# Altium footprint library Conectores.PcbLib: 122 footprints (part 5 of 8)
Each footprint in its own frame and in the unit in brackets; x right, y up, seen from the top. Pads: shape width x height; smd on the part's side, far side on the other; paste and mask are expansions set on the pad; w line width, h text height; cw(c..) or ccw(c..) is an arc to the next point about the centre after c.
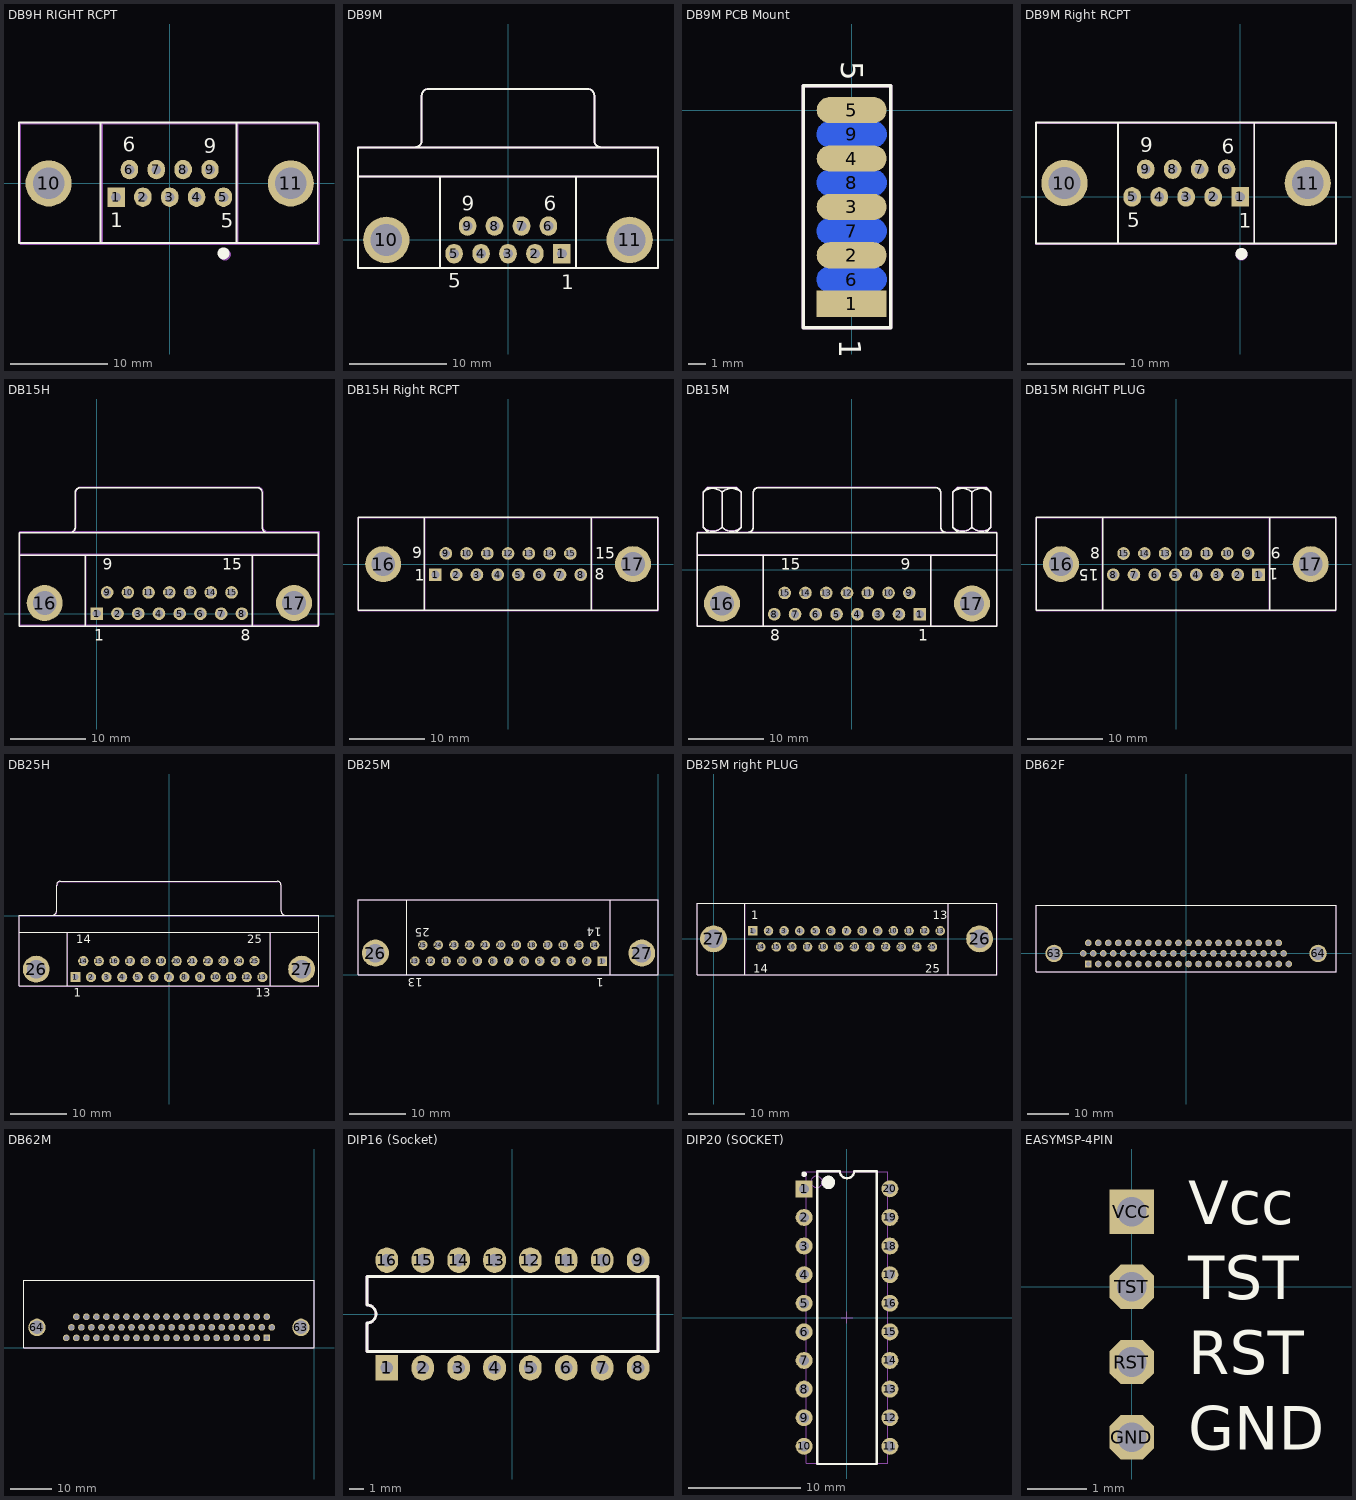
[diagram p4: the footprints below, top view; thin cyan lines are the x and y axes]

## DB9H RIGHT RCPT [mm] "DB9 Hembra recto"
pads (11):
  rect 1.8x2 hole 1: 1(-5.54,-1.42)
  oval 1.8x2 hole 1: 2(-2.77,-1.42) 3(0,-1.42) 4(2.77,-1.42) 5(5.54,-1.42) 6(-4.155,1.42) 7(-1.385,1.42) 8(1.385,1.42) 9(4.155,1.42)
  round 4.76 hole 3.26: 10(-12.495,0) 11(12.495,0)
Top Overlay:
  circle w1: c5.557,-7.218 r0.114
  lines w0.2: -7.13,-6.024 -7.13,6.295 ; 6.87,-6.101 6.87,6.244 ; -15.551,-6.151 15.27,-6.151 15.27,6.295 -15.551,6.295 -15.551,-6.151
  text "9" at 3.525,3.094 h1.5
  text "6" at -4.832,3.247 h1.5
  text "1" at -6.153,-4.5 h1.5
  text "5" at 5.277,-4.551 h1.5
Mechanical 29:
  circle w1: c5.687,-7.338 r0.114
  lines w0.2: -7,-6.144 -7,6.175 ; 7,-6.221 7,6.124 ; -15.421,-6.271 -15.421,6.175 15.4,6.175 15.4,-6.271 -15.421,-6.271
  text "5" at 5.407,-4.671 h1.5
  text "1" at -6.023,-4.62 h1.5
  text "6" at -4.702,3.127 h1.5
  text "9" at 3.655,2.974 h1.5
  text "'.Designator'" at -14.548,-5.482 h0.5
3D body "DB9Recept_VerticalMount.step": height 13.2, standoff -4.66, extent -15.405,-6.274 15.405,6.274

## DB9M [mm]
pads (11):
  rect 1.8x2 hole 1: 1(5.54,-1.42)
  oval 1.8x2 hole 1: 2(2.77,-1.42) 3(0,-1.42) 4(-2.77,-1.42) 5(-5.54,-1.42) 6(4.155,1.42) 7(1.385,1.42) 8(-1.385,1.42) 9(-4.155,1.42)
  round 4.76 hole 3.26: 10(-12.495,0) 11(12.495,0)
Top Overlay:
  lines w0.2: -15.4,6.5 15.4,6.5 ; -9.56,9.505 ccw(c-9.56,10.2) -8.865,10.2 -8.865,14.8 ; -8.86,14.805 cw(c-8.165,14.805) -8.165,15.5 8.165,15.5 cw(c8.165,14.805) 8.86,14.805 ; -7,-2.9 -7,6.5 ; 7,-2.9 7,6.5 ; 8.865,14.8 8.865,10.2 ccw(c9.56,10.2) 9.56,9.505 ; -15.4,-2.9 -15.4,9.5 15.4,9.5 15.4,-2.9 -15.4,-2.9
  text "1" at 5.484,-5.052 h1.5
  text "5" at -6.124,-4.925 h1.5
  text "9" at -4.727,3 h1.5
  text "6" at 3.655,2.974 h1.5
Mechanical 29:
  lines w0.2: -15.4,6.5 15.4,6.5 ; -9.56,9.505 ccw(c-9.56,10.2) -8.865,10.2 -8.865,14.8 ; -8.86,14.805 cw(c-8.165,14.805) -8.165,15.5 8.165,15.5 cw(c8.165,14.805) 8.86,14.805 ; -7,-2.9 -7,6.5 ; 7,-2.9 7,6.5 ; 8.865,14.8 8.865,10.2 ccw(c9.56,10.2) 9.56,9.505 ; -15.4,-2.9 15.4,-2.9 15.4,9.5 -15.4,9.5 -15.4,-2.9
  text "6" at 3.655,2.974 h1.5
  text "9" at -4.727,3 h1.5
  text "5" at -6.124,-4.925 h1.5
  text "1" at 5.484,-5.052 h1.5
  text "'.Designator'" at -14.738,7.698 h0.5
3D body "182-009-113.STEP": height 12.55, standoff -3.17, extent -15.395,-2.951 15.415,15.54

## DB9M PCB Mount [mm] "DB9H para montar entre PCB"
pads (9):
  rect 4x1.5 smd: 1(0,-11.08)
  oval 4x1.5 smd: 2(0,-8.31) 3(0,-5.54) 4(0,-2.77) 5(0,0)
  oval 4x1.5 smd far side: 6(0,-9.695) 7(0,-6.925) 8(0,-4.155) 9(0,-1.385)
Top Overlay:
  lines w0.2: -2.77,-12.465 -2.77,1.385 2.235,1.385 2.235,-12.465 -2.77,-12.465
  text "5" at -0.6,2.8 h1.27
  text "1" at -0.7,-13.1 h1.27
Mechanical 29:
  lines w0.2: -2.77,-12.465 2.235,-12.465 2.235,1.385 -2.77,1.385 -2.77,-12.465
  text "1" at -0.7,-13.1 h1.27
  text "5" at -0.6,2.8 h1.27
  text "'.Designator'" at -1.838,-12.018 h0.5

## DB9M Right RCPT [mm]
pads (11):
  rect 1.8x2 hole 1: 1(0,0)
  oval 1.8x2 hole 1: 2(-2.77,0) 3(-5.54,0) 4(-8.31,0) 5(-11.08,0) 6(-1.385,2.84) 7(-4.155,2.84) 8(-6.925,2.84) 9(-9.695,2.84)
  round 4.76 hole 3.26: 10(-18.035,1.42) 11(6.955,1.42)
Top Overlay:
  circle w1: c0.147,-5.858 r0.114
  lines w0.2: -12.54,-4.664 -12.54,7.655 ; 1.46,-4.741 1.46,7.604 ; -20.961,-4.791 -20.961,7.655 9.86,7.655 9.86,-4.791 -20.961,-4.791
  text "1" at -0.133,-3.191 h1.5
  text "5" at -11.563,-3.14 h1.5
  text "9" at -10.242,4.607 h1.5
  text "6" at -1.885,4.454 h1.5
Mechanical 29:
  circle w1: c0.147,-5.918 r0.114
  lines w0.2: -12.54,-4.724 -12.54,7.595 ; 1.46,-4.801 1.46,7.544 ; -20.961,-4.851 9.86,-4.851 9.86,7.595 -20.961,7.595 -20.961,-4.851
  text "6" at -1.885,4.394 h1.5
  text "9" at -10.242,4.547 h1.5
  text "5" at -11.563,-3.2 h1.5
  text "1" at -0.133,-3.251 h1.5
  text "'.Designator'" at -20.388,-4.212 h0.5
3D body "DB9 Macho Recto.step": height 13.5, standoff -3.7, extent -20.968,-4.905 9.832,7.595

## DB15H [mm]
pads (17):
  rect 1.69x1.69 hole 1.09: 1(0,0)
  round 1.69 hole 1.09: 2(2.77,0) 3(5.54,0) 4(8.31,0) 5(11.08,0) 6(13.85,0) 7(16.62,0) 8(19.39,0) 9(1.385,2.84) 10(4.155,2.84) 11(6.925,2.84) 12(9.695,2.84) 13(12.465,2.84) 14(15.235,2.84) 15(18.005,2.84)
  round 4.8 hole 3.18: 16(-6.965,1.42) 17(26.355,1.42)
Top Overlay:
  lines w0.2: -10.395,7.83 29.605,7.83 ; -3.59,10.835 ccw(c-3.59,11.53) -2.895,11.53 -2.895,16.13 ; -2.89,16.135 cw(c-2.195,16.135) -2.195,16.83 21.405,16.83 cw(c21.405,16.135) 22.1,16.135 ; -1.535,-1.67 -1.535,7.83 ; 20.745,-1.67 20.745,7.83 ; 22.105,16.13 22.105,11.53 ccw(c22.8,11.53) 22.8,10.835 ; -10.395,-1.67 -10.395,10.83 29.605,10.83 29.605,-1.67 -10.395,-1.67
  text "1" at -0.34,-3.645 h1.5
  text "8" at 19.257,-3.645 h1.5
  text "15" at 16.79,5.855 h1.5
  text "9" at 0.795,5.855 h1.5
Mechanical 29:
  lines w0.2: -10.305,7.92 29.695,7.92 ; -3.5,10.925 ccw(c-3.5,11.62) -2.805,11.62 -2.805,16.22 ; -2.8,16.225 cw(c-2.105,16.225) -2.105,16.92 21.495,16.92 cw(c21.495,16.225) 22.19,16.225 ; -1.445,-1.58 -1.445,7.92 ; 20.835,-1.58 20.835,7.92 ; 22.195,16.22 22.195,11.62 ccw(c22.89,11.62) 22.89,10.925 ; -10.305,-1.58 29.695,-1.58 29.695,10.92 -10.305,10.92 -10.305,-1.58
  text "9" at 0.885,5.945 h1.5
  text "15" at 16.88,5.945 h1.5
  text "8" at 19.347,-3.555 h1.5
  text "1" at -0.25,-3.555 h1.5
  text "'.Designator'" at -9.388,9.018 h0.5
3D body "DB15RA_F-DEFAULT.step": height 12.55, standoff -3.5, extent -10.183,-1.778 29.437,16.622

## DB15H Right RCPT [mm] "DB15 Hembra Recto"
pads (17):
  rect 1.69x1.69 hole 1.09: 1(-9.695,-1.42)
  round 1.69 hole 1.09: 2(-6.925,-1.42) 3(-4.155,-1.42) 4(-1.385,-1.42) 5(1.385,-1.42) 6(4.155,-1.42) 7(6.925,-1.42) 8(9.695,-1.42) 9(-8.31,1.42) 10(-5.54,1.42) 11(-2.77,1.42) 12(0,1.42) 13(2.77,1.42) 14(5.54,1.42) 15(8.31,1.42)
  round 4.8 hole 3.18: 16(-16.66,0) 17(16.66,0)
Top Overlay:
  lines w0.2: -20.02,-6.17 19.98,-6.17 ; -20.02,-6.168 -20.02,6.192 -19.982,6.23 19.98,6.23 ; -11.16,-6.142 -11.16,6.202 ; 11.12,-6.142 11.12,6.228 ; 19.98,-6.142 19.98,6.228
  text "1" at -12.441,-2.205 h1.5
  text "8" at 11.562,-2.104 h1.5
  text "15" at 11.613,0.741 h1.5
  text "9" at -12.771,0.767 h1.5
Mechanical 29:
  lines w0.2: -20,-6.2 20,-6.2 ; -20,-6.198 -20,6.162 -19.962,6.2 20,6.2 ; -11.14,-6.172 -11.14,6.172 ; 11.14,-6.172 11.14,6.198 ; 20,-6.172 20,6.198
  text "'.Designator'" at -19.338,4.918 h0.5
  text "9" at -12.751,0.737 h1.5
  text "15" at 11.633,0.711 h1.5
  text "8" at 11.582,-2.134 h1.5
  text "1" at -12.421,-2.235 h1.5
3D body "CircuitWorks-DB15_F.step": height 12.2, standoff -3.52, extent -19.975,-6.498 20.025,6.502

## DB15M [mm]
pads (17):
  rect 1.69x1.69 hole 1.09: 1(9.035,-5.916)
  round 1.69 hole 1.09: 2(6.265,-5.916) 3(3.495,-5.916) 4(0.725,-5.916) 5(-2.045,-5.916) 6(-4.815,-5.916) 7(-7.585,-5.916) 8(-10.355,-5.916) 9(7.65,-3.076) 10(4.88,-3.076) 11(2.11,-3.076) 12(-0.66,-3.076) 13(-3.43,-3.076) 14(-6.2,-3.076) 15(-8.97,-3.076)
  round 4.8 hole 3.18: 16(-17.32,-4.496) 17(16,-4.496)
Top Overlay:
  lines w0.2: -20.66,1.974 19.34,1.974 ; -19.848,5.674 -19.213,5.039 ; -19.848,5.674 -19.848,10.324 ; -19.848,10.339 -19.213,10.974 -15.403,10.974 -14.768,10.339 ; -17.308,5.674 -17.308,10.324 ; -15.403,5.039 -14.768,5.674 ; -14.768,9.06 -14.768,9.272 ; -14.768,10.324 -14.768,5.674 ; -13.855,4.979 ccw(c-13.855,5.674) -13.16,5.674 -13.16,10.274 ; -13.155,10.279 cw(c-12.46,10.279) -12.46,10.974 11.14,10.974 cw(c11.14,10.279) 11.835,10.279 ; -11.8,-7.526 -11.8,1.974 ; 10.48,-7.526 10.48,1.974 ; 11.84,10.274 11.84,5.674 ccw(c12.535,5.674) 12.535,4.979 ; 13.452,10.324 13.452,5.674 14.087,5.039 ; 13.452,10.339 14.087,10.974 17.897,10.974 18.532,10.339 ; 15.992,5.674 15.992,10.324 ; 17.897,5.039 18.532,5.674 18.532,10.324 ; 18.532,9.06 18.532,9.272 ; -20.66,-7.526 19.34,-7.526 19.34,4.974 -20.66,4.974 -20.66,-7.526
  lines w0.203: -19.85,5.671 ccw(c-18.578,6.944) -17.306,5.671 ; -19.848,10.324 cw(c-18.576,9.052) -17.304,10.324 ; -17.313,10.324 cw(c-16.04,9.052) -14.768,10.324 ; -17.31,5.671 ccw(c-16.038,6.944) -14.766,5.671 ; 13.45,5.671 ccw(c14.722,6.944) 15.994,5.671 ; 13.452,10.324 cw(c14.724,9.052) 15.996,10.324 ; 15.987,10.324 cw(c17.26,9.052) 18.532,10.324 ; 15.99,5.671 ccw(c17.262,6.944) 18.534,5.671
  text "15" at -9.47,-0.001 h1.5
  text "9" at 6.525,-0.001 h1.5
  text "1" at 8.87,-9.45 h1.5
  text "8" at -10.91,-9.45 h1.5
Mechanical 13:
  lines w0.1: -20.66,2.004 19.34,2.004 ; -19.85,5.701 ccw(c-18.578,6.974) -17.306,5.701 ; -19.848,5.704 -19.213,5.069 ; -19.848,5.704 -19.848,10.354 cw(c-18.576,9.082) -17.304,10.354 ; -19.848,10.369 -19.213,11.004 -15.403,11.004 -14.768,10.369 ; -17.313,10.354 cw(c-16.04,9.082) -14.768,10.354 -14.768,5.704 ; -17.31,5.701 ccw(c-16.038,6.974) -14.766,5.701 ; -17.308,5.704 -17.308,10.354 ; -15.403,5.069 -14.768,5.704 ; -14.768,9.09 -14.768,9.302 ; -13.855,5.009 ccw(c-13.855,5.704) -13.16,5.704 -13.16,10.304 ; -13.155,10.309 cw(c-12.46,10.309) -12.46,11.004 11.14,11.004 cw(c11.14,10.309) 11.835,10.309 ; -11.8,-7.496 -11.8,2.004 ; 10.48,-7.496 10.48,2.004 ; 11.84,10.304 11.84,5.704 ccw(c12.535,5.704) 12.535,5.009 ; 13.45,5.701 ccw(c14.722,6.974) 15.994,5.701 ; 13.452,10.369 14.087,11.004 17.897,11.004 18.532,10.369 ; 14.087,5.069 13.452,5.704 13.452,10.354 cw(c14.724,9.082) 15.996,10.354 ; 15.987,10.354 cw(c17.26,9.082) 18.532,10.354 18.532,5.704 17.897,5.069 ; 15.99,5.701 ccw(c17.262,6.974) 18.534,5.701 ; 15.992,5.704 15.992,10.354 ; 18.532,9.09 18.532,9.302 ; -20.66,-7.496 -20.66,5.004 19.34,5.004 19.34,-7.496 -20.66,-7.496
Mechanical 29:
  lines w0.2: -20.66,2.004 19.34,2.004 ; -19.848,5.704 -19.213,5.069 ; -19.848,5.704 -19.848,10.354 ; -19.848,10.369 -19.213,11.004 -15.403,11.004 -14.768,10.369 ; -17.308,5.704 -17.308,10.354 ; -15.403,5.069 -14.768,5.704 ; -14.768,9.09 -14.768,9.302 ; -14.768,10.354 -14.768,5.704 ; -13.855,5.009 ccw(c-13.855,5.704) -13.16,5.704 -13.16,10.304 ; -13.155,10.309 cw(c-12.46,10.309) -12.46,11.004 11.14,11.004 cw(c11.14,10.309) 11.835,10.309 ; -11.8,-7.496 -11.8,2.004 ; 10.48,-7.496 10.48,2.004 ; 11.84,10.304 11.84,5.704 ccw(c12.535,5.704) 12.535,5.009 ; 13.452,10.354 13.452,5.704 14.087,5.069 ; 13.452,10.369 14.087,11.004 17.897,11.004 18.532,10.369 ; 15.992,5.704 15.992,10.354 ; 17.897,5.069 18.532,5.704 18.532,10.354 ; 18.532,9.09 18.532,9.302 ; -20.66,-7.496 -20.66,5.004 19.34,5.004 19.34,-7.496 -20.66,-7.496
  lines w0.203: -19.85,5.701 ccw(c-18.578,6.974) -17.306,5.701 ; -19.848,10.354 cw(c-18.576,9.082) -17.304,10.354 ; -17.313,10.354 cw(c-16.04,9.082) -14.768,10.354 ; -17.31,5.701 ccw(c-16.038,6.974) -14.766,5.701 ; 13.45,5.701 ccw(c14.722,6.974) 15.994,5.701 ; 13.452,10.354 cw(c14.724,9.082) 15.996,10.354 ; 15.987,10.354 cw(c17.26,9.082) 18.532,10.354 ; 15.99,5.701 ccw(c17.262,6.974) 18.534,5.701
  text "'.Designator'" at -19.988,3.218 h0.5
  text "8" at -10.605,-9.471 h1.5
  text "1" at 8.535,-9.471 h1.5
  text "9" at 6.525,0.029 h1.5
  text "15" at -9.47,0.029 h1.5
3D body "User Library-DA-15P-1A5N-A191.STEP": height 13.6, standoff -3.95, extent -20.091,-7.784 19.409,13.016

## DB15M RIGHT PLUG [mm]
pads (17):
  rect 1.69x1.69 hole 1.09: 1(10.965,-1.369)
  round 1.69 hole 1.09: 2(8.195,-1.369) 3(5.425,-1.369) 4(2.655,-1.369) 5(-0.115,-1.369) 6(-2.885,-1.369) 7(-5.655,-1.369) 8(-8.425,-1.369) 9(9.58,1.471) 10(6.81,1.471) 11(4.04,1.471) 12(1.27,1.471) 13(-1.5,1.471) 14(-4.27,1.471) 15(-7.04,1.471)
  round 4.8 hole 3.18: 16(-15.39,0.051) 17(17.93,0.051)
Top Overlay:
  lines w0.2: -18.69,-6.119 21.31,-6.119 ; -18.69,-6.117 -18.69,6.243 -18.652,6.281 21.31,6.281 ; -9.83,-6.091 -9.83,6.253 ; 12.45,-6.091 12.45,6.278 ; 21.31,-6.091 21.31,6.278
  text "1" at 13.629,-0.529 h1.5
  text "8" at -11.492,0.767 h1.5
  text "15" at -10.323,-0.605 h1.5
  text "9" at 13.959,2.316 h1.5
Mechanical 29:
  lines w0.2: -18.73,-6.149 21.27,-6.149 ; -18.73,-6.147 -18.73,6.213 -18.692,6.251 21.27,6.251 ; -9.87,-6.121 -9.87,6.223 ; 12.41,-6.121 12.41,6.248 ; 21.27,-6.121 21.27,6.248
  text "'.Designator'" at -17.608,5.378 h0.5
  text "9" at 13.919,2.286 h1.5
  text "15" at -10.363,-0.635 h1.5
  text "8" at -11.532,0.737 h1.5
  text "1" at 13.589,-0.559 h1.5
3D body "DB15_M.step": height 12.37, standoff -3.49, extent -18.578,-6.426 21.422,6.574

## DB25H [mm]
pads (27):
  rect 1.8x1.8 hole 1.09: 1(-16.613,-10.903)
  round 1.8 hole 1.09: 2(-13.852,-10.903) 3(-11.091,-10.903) 4(-8.33,-10.903) 5(-5.569,-10.903) 6(-2.808,-10.903) 7(-0.047,-10.903) 8(2.714,-10.903) 9(5.475,-10.903) 10(8.236,-10.903) 11(10.997,-10.903) 12(13.758,-10.903) 13(16.519,-10.903) 14(-15.233,-8.063) 15(-12.472,-8.063) 16(-9.711,-8.063) 17(-6.95,-8.063) 18(-4.189,-8.063) 19(-1.428,-8.063) 20(1.333,-8.063) 21(4.094,-8.063) 22(6.855,-8.063) 23(9.616,-8.063) 24(12.377,-8.063) 25(15.138,-8.063)
  round 4.76 hole 3.26: 26(-23.573,-9.483) 27(23.479,-9.483)
Top Overlay:
  lines w0.2: -26.623,-2.903 26.477,-2.903 ; -20.668,0.102 ccw(c-20.668,0.797) -19.973,0.797 -19.973,5.397 ; -19.968,5.402 cw(c-19.273,5.402) -19.273,6.097 19.127,6.097 cw(c19.127,5.402) 19.822,5.402 ; -18.073,-12.403 -18.073,-2.903 ; 17.927,-12.403 17.927,-2.903 ; 19.827,5.397 19.827,0.797 ccw(c20.522,0.797) 20.522,0.102 ; -26.623,-12.403 -26.623,0.097 26.477,0.097 26.477,-12.403 -26.623,-12.403
  text "25" at 13.808,-4.878 h1.5
  text "14" at -16.438,-4.878 h1.5
  text "13" at 15.314,-14.378 h1.5
  text "1" at -16.943,-14.378 h1.5
Mechanical 29:
  lines w0.2: -26.543,-2.983 26.557,-2.983 ; -20.588,0.022 ccw(c-20.588,0.717) -19.893,0.717 -19.893,5.317 ; -19.888,5.322 cw(c-19.193,5.322) -19.193,6.017 19.207,6.017 cw(c19.207,5.322) 19.902,5.322 ; -17.993,-12.483 -17.993,-2.983 ; 18.007,-12.483 18.007,-2.983 ; 19.907,5.317 19.907,0.717 ccw(c20.602,0.717) 20.602,0.022 ; -26.543,-12.483 26.557,-12.483 26.557,0.017 -26.543,0.017 -26.543,-12.483
  text "'.Designator'" at -25.75,-1.71 h0.5
  text "1" at -16.863,-14.458 h1.5
  text "13" at 15.394,-14.458 h1.5
  text "14" at -16.358,-4.958 h1.5
  text "25" at 13.888,-4.958 h1.5
3D body "dsub25 H connector.step": height 4.08, standoff -13.08, extent -26.725,-12.703 26.315,7.797

## DB25M [mm]
pads (27):
  rect 1.69x1.69 hole 1.09: 1(-9.83,2.388)
  round 1.69 hole 1.09: 2(-12.591,2.388) 3(-15.352,2.388) 4(-18.113,2.388) 5(-20.874,2.388) 6(-23.635,2.388) 7(-26.396,2.388) 8(-29.157,2.388) 9(-31.918,2.388) 10(-34.679,2.388) 11(-37.44,2.388) 12(-40.201,2.388) 13(-42.962,2.388) 14(-11.21,5.228) 15(-13.971,5.228) 16(-16.732,5.228) 17(-19.493,5.228) 18(-22.254,5.228) 19(-25.015,5.228) 20(-27.776,5.228) 21(-30.537,5.228) 22(-33.298,5.228) 23(-36.059,5.228) 24(-38.82,5.228) 25(-41.581,5.228)
  round 4.76 hole 3.26: 26(-49.922,3.808) 27(-2.87,3.808)
Top Overlay:
  lines w0.2: -44.396,0.048 -44.396,13.259 ; -8.45,0.048 -8.45,13.259 ; -53,-0.002 -53,13.259 -0.004,13.259 -0.004,-0.002 -53,-0.002
  text "25" at -40.335,8.227 h1.5
  text "14" at -9.956,8.303 h1.5
  text "13" at -41.554,-0.612 h1.5
  text "1" at -9.601,-0.663 h1.5
Mechanical 29:
  lines w0.2: -44.396,0.048 -44.396,13.259 ; -8.45,0.048 -8.45,13.259 ; -53,-0.002 -0.004,-0.002 -0.004,13.259 -53,13.259 -53,-0.002
  text "'.Designator'" at -43.398,11.618 h0.5
  text "1" at -9.601,-0.663 h1.5
  text "13" at -41.554,-0.612 h1.5
  text "14" at -9.956,8.303 h1.5
  text "25" at -40.335,8.227 h1.5
3D body "DB25M PCB.STEP": height 12.57, standoff -3.15, extent -52.882,0.148 0.153,19.274

## DB25M right PLUG [mm]
pads (27):
  rect 1.69x1.69 hole 1.09: 1(6.96,1.42)
  round 1.69 hole 1.09: 2(9.721,1.42) 3(12.482,1.42) 4(15.243,1.42) 5(18.004,1.42) 6(20.765,1.42) 7(23.526,1.42) 8(26.287,1.42) 9(29.048,1.42) 10(31.809,1.42) 11(34.57,1.42) 12(37.331,1.42) 13(40.092,1.42) 14(8.34,-1.42) 15(11.101,-1.42) 16(13.862,-1.42) 17(16.623,-1.42) 18(19.384,-1.42) 19(22.145,-1.42) 20(24.906,-1.42) 21(27.667,-1.42) 22(30.428,-1.42) 23(33.189,-1.42) 24(35.95,-1.42) 25(38.711,-1.42)
  round 4.76 hole 3.26: 26(47.052,0) 27(0,0)
Top Overlay:
  lines w0.2: 5.52,-6.275 5.52,6.275 ; 41.467,-6.275 41.467,6.275 ; -2.926,-6.341 50.07,-6.341 50.07,6.298 -2.926,6.298 -2.926,-6.341
  text "1" at 6.65,3.48 h1.5
  text "13" at 38.782,3.48 h1.5
  text "14" at 7.03,-6.02 h1.5
  text "25" at 37.401,-6.02 h1.5
Mechanical 29:
  lines w0.2: 5.58,-6.275 5.58,6.275 ; 41.527,-6.275 41.527,6.275 ; -2.866,-6.341 -2.866,6.298 50.13,6.298 50.13,-6.341 -2.866,-6.341
  text "25" at 37.461,-6.02 h1.5
  text "14" at 7.09,-6.02 h1.5
  text "13" at 38.842,3.48 h1.5
  text "1" at 6.71,3.48 h1.5
  text "'.Designator'" at -1.648,5.018 h0.5
3D body "CircuitWorks-DB25_M.step": height 12.37, standoff -3.49, extent -3.506,-6.498 50.344,6.502

## DB62F [mm] "DB62 para PCB hembra"
pads (65):
  rect 1.6x1.6 hole 1.19: 1(-23.52,-2.54)
  round 1.6 hole 1.19: 2(-21.11,-2.54) 3(-18.7,-2.54) 4(-16.29,-2.54) 5(-13.88,-2.54) 6(-11.47,-2.54) 7(-9.06,-2.54) 8(-6.65,-2.54) 9(-4.24,-2.54) 10(-1.83,-2.54) 11(0.58,-2.54) 12(2.99,-2.54) 13(5.4,-2.54) 14(7.81,-2.54) 15(10.22,-2.54) 16(12.63,-2.54) 17(15.04,-2.54) 18(17.45,-2.54) 19(19.86,-2.54) 20(22.27,-2.54) 21(24.68,-2.54) 22(-24.74,0) 23(-22.33,0) 24(-19.92,0) 25(-17.51,0) 26(-15.1,0) 27(-12.69,0) 28(-10.28,0) 29(-7.87,0) 30(-5.46,0) 31(-3.05,0) 32(-0.64,0) 33(1.77,0) 34(4.18,0) 35(6.59,0) 36(9,0) 37(11.41,0) 38(13.82,0) 39(16.23,0) 40(18.64,0) 41(21.05,0) 42(23.46,0) 43(-23.52,2.54) 43(-23.52,2.54) 44(-21.11,2.54) 45(-18.7,2.54) 46(-16.29,2.54) 47(-13.88,2.54) 48(-11.47,2.54) 49(-9.06,2.54) 50(-6.65,2.54) 51(-4.24,2.54) 52(-1.83,2.54) 53(0.58,2.54) 54(2.99,2.54) 55(5.4,2.54) 56(7.81,2.54) 57(10.22,2.54) 58(12.63,2.54) 59(15.04,2.54) 60(17.45,2.54) 61(19.86,2.54) 62(22.27,2.54)
  round 4.2 hole 3.18: 63(-31.75,0) 64(31.75,0)
Top Overlay:
  lines w0.254: -36.09,-4.4 36.06,-4.4 36.06,11.55 -36.09,11.55 -36.09,-4.4
Top Paste:
  lines w0.254: -36.09,-4.579 -36.04,-4.6 ; 36.01,4.85 36.06,4.8
Mechanical 29:
  lines w0.254: -36.09,-4.4 -36.09,11.55 36.06,11.55 36.06,-4.4 -36.09,-4.4
  text "1" at -25.22,-2.91 h0.8
  text "'.Designator'" at -35.158,9.828 h0.5
3D body "DB62 Male.STEP": height 9.6, standoff -5, extent -36.14,-4.55 36.06,16.45

## DB62M [mm] "DB62 para PCB macho"
pads (64):
  rect 1.6x1.6 hole 1.19: 1(-11.385,2.362)
  round 1.6 hole 1.19: 2(-13.795,2.362) 3(-16.205,2.362) 4(-18.615,2.362) 5(-21.025,2.362) 6(-23.435,2.362) 7(-25.845,2.362) 8(-28.255,2.362) 9(-30.665,2.362) 10(-33.075,2.362) 11(-35.485,2.362) 12(-37.895,2.362) 13(-40.305,2.362) 14(-42.715,2.362) 15(-45.125,2.362) 16(-47.535,2.362) 17(-49.945,2.362) 18(-52.355,2.362) 19(-54.765,2.362) 20(-57.175,2.362) 21(-59.585,2.362) 22(-10.165,4.902) 23(-12.575,4.902) 24(-14.985,4.902) 25(-17.395,4.902) 26(-19.805,4.902) 27(-22.215,4.902) 28(-24.625,4.902) 29(-27.035,4.902) 30(-29.445,4.902) 31(-31.855,4.902) 32(-34.265,4.902) 33(-36.675,4.902) 34(-39.085,4.902) 35(-41.495,4.902) 36(-43.905,4.902) 37(-46.315,4.902) 38(-48.725,4.902) 39(-51.135,4.902) 40(-53.545,4.902) 41(-55.955,4.902) 42(-58.365,4.902) 43(-11.385,7.442) 44(-13.795,7.442) 45(-16.205,7.442) 46(-18.615,7.442) 47(-21.025,7.442) 48(-23.435,7.442) 49(-25.845,7.442) 50(-28.255,7.442) 51(-30.665,7.442) 52(-33.075,7.442) 53(-35.485,7.442) 54(-37.895,7.442) 55(-40.305,7.442) 56(-42.715,7.442) 57(-45.125,7.442) 58(-47.535,7.442) 59(-49.945,7.442) 60(-52.355,7.442) 61(-54.765,7.442) 62(-57.175,7.442)
  round 4.2 hole 3.18: 63(-3.155,4.902) 64(-66.655,4.902)
Top Overlay:
  lines w0.254: -69.825,0 0,0 0,16.23 -69.825,16.23 -69.825,0
Top Paste:
  lines w0.254: -70.965,0.102 -70.915,0.052 ; 1.135,9.502 1.185,9.481
Mechanical 29:
  lines w0.254: -69.825,0 -69.825,16.23 0,16.23 0,0 -69.825,0
  text "1" at -9.66,1.97 h0.8
  text "'.Designator'" at -68.848,14.488 h0.5
3D body "181-062-113.STEP": height 12.6, standoff -3.17, extent -69.703,0.127 -0.102,22.352

## DIP16 (Socket) [mm] "110-13-316-41-001000"
pads (16):
  rect 1.6x1.8 hole 0.9: 1(-8.89,-3.81)
  oval 1.6x1.8 hole 0.9: 2(-6.35,-3.81) 3(-3.81,-3.81) 4(-1.27,-3.81) 5(1.27,-3.81) 6(3.81,-3.81) 7(6.35,-3.81) 8(8.89,-3.81) 9(8.89,3.81) 10(6.35,3.81) 11(3.81,3.81) 12(1.27,3.81) 13(-1.27,3.81) 14(-3.81,3.81) 15(-6.35,3.81) 16(-8.89,3.81)
Top Overlay:
  lines w0.2: -10.3,-2.65 10.3,-2.65 10.3,2.65 -10.3,2.65 -10.3,0.635 cw(c-10.3,0) -10.3,-0.635 -10.3,-2.65
Mechanical 29:
  lines w0.2: -10.3,-2.65 -10.3,-0.635 ccw(c-10.3,0) -10.3,0.635 -10.3,2.65 10.3,2.65 10.3,-2.65 -10.3,-2.65
3D body "DIPS762W51P254L2032H419Q16_DIP_Socket_16__300.step": height 4.19, standoff -3.18, extent -10.18,-5.07 10.14,5.09

## DIP20 (SOCKET) [mm] "DIP, 20-Pin, Row Spacing 7.62 mm, Pitch 2.54 mm"
height 5.08
pads (20):
  rect 1.5x1.5 hole 0.9: 1(-3.81,11.43)
  round 1.5 hole 0.9: 2(-3.81,8.89) 3(-3.81,6.35) 4(-3.81,3.81) 5(-3.81,1.27) 6(-3.81,-1.27) 7(-3.81,-3.81) 8(-3.81,-6.35) 9(-3.81,-8.89) 10(-3.81,-11.43) 11(3.81,-11.43) 12(3.81,-8.89) 13(3.81,-6.35) 14(3.81,-3.81) 15(3.81,-1.27) 16(3.81,1.27) 17(3.81,3.81) 18(3.81,6.35) 19(3.81,8.89) 20(3.81,11.43)
Top Overlay:
  circle w0.25: c-3.81,12.73 r0.125
  circle w0.6: c-1.65,12 r0.3
  lines w0.2: -2.65,-13 -2.65,13 -0.635,13 ccw(c0,13) 0.635,13 2.65,13 2.65,-13 -2.65,-13
Mechanical 13:
  circle w0.1: c-2.7,12.05 r0.5
  lines w0.1: -3.6,-12.95 -3.6,12.95 3.6,12.95 3.6,-12.95 -3.6,-12.95
Mechanical 15:
  lines w0.1: -0.5,0 0.5,0 ; 0,-0.5 0,0.5
3D body "User Library-20pin 0_3inch 2_54mm IC DIP Socket Round Hole.step": height 4.71, standoff -2.8, extent -5.1,-12.75 5.06,12.65

## EASYMSP-4PIN [mm]
pads (4):
  oct 0.75x0.75 hole 0.5: GND(0,-2.54) RST(0,-1.27) TST(0,0)
  rect 0.75x0.75 hole 0.5: VCC(0,1.27)
Top Overlay:
  text "Vcc" at 0.953,0.817 h1.26
  text "TST" at 0.953,-0.453 h1.26
  text "RST" at 0.953,-1.723 h1.26
  text "GND" at 0.953,-2.993 h1.26
Mechanical 29:
  text "GND" at 0.953,-3.013 h1.26
  text "RST" at 0.953,-1.743 h1.26
  text "TST" at 0.953,-0.473 h1.26
  text "Vcc" at 0.953,0.797 h1.26
  text "'.Designator'" at -1.21,1.72 h0.5